# Altium footprint library decade_box_lib.PcbLib: 19 footprints (part 2 of 2)
Each footprint in its own frame and in the unit in brackets; x right, y up, seen from the top. Pads: shape width x height; smd on the part's side, far side on the other; paste and mask are expansions set on the pad; w line width, h text height; cw(c..) or ccw(c..) is an arc to the next point about the centre after c.
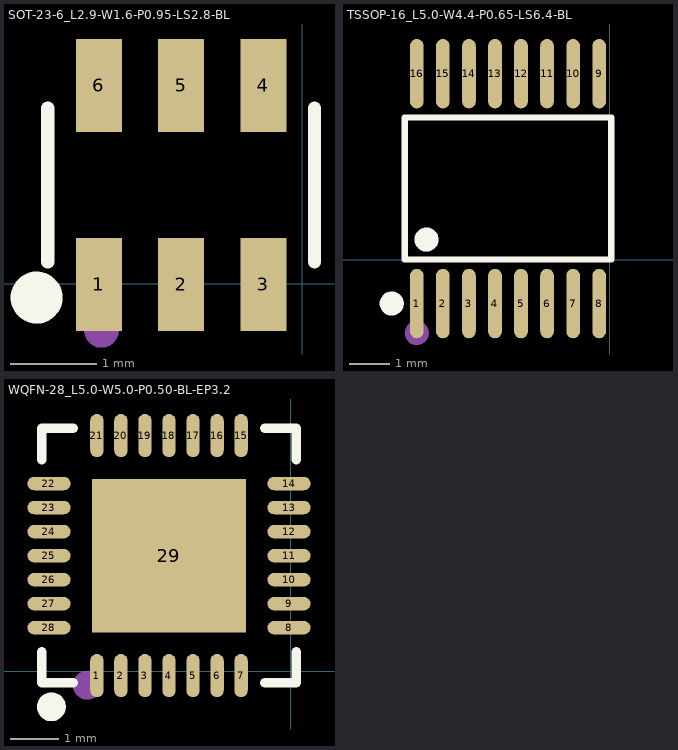
[diagram p1: the footprints below, top view; thin cyan lines are the x and y axes]

## SOT-23-6_L2.9-W1.6-P0.95-LS2.8-BL [mil]
pads (6):
  rect 20.95x42.2 smd: 1(-92.4,-0.24) 2(-55,-0.24) 3(-17.6,-0.24) 4(-17.6,90.24) 5(-55,90.24) 6(-92.4,90.24)
Top Overlay:
  circle w11.81: c-120.68,-6.24 r5.91
  lines w6: -115.6,9.99 -115.6,80.01 ; 5.6,9.99 5.6,80.01
Mechanical 15:
  circle w7.87: c-91.22,-21.14 r3.94
3D body "asd.stp": height 65.45, standoff 0.99, extent -112.1,-10.86 1.26,99.09

## TSSOP-16_L5.0-W4.4-P0.65-LS6.4-BL [mm]
pads (16):
  oval 0.343x1.731 smd: 1(-4.815,-1.088) 2(-4.165,-1.088) 3(-3.515,-1.088) 4(-2.865,-1.088) 5(-2.215,-1.088) 6(-1.565,-1.088) 7(-0.915,-1.088) 8(-0.265,-1.088) 9(-0.265,4.644) 10(-0.915,4.644) 11(-1.565,4.644) 12(-2.215,4.644) 13(-2.865,4.644) 14(-3.515,4.644) 15(-4.165,4.644) 16(-4.815,4.644)
Top Overlay:
  circle w0.3: c-5.439,-1.088 r0.15
  circle w0.3: c-4.572,0.508 r0.15
  lines w0.152: -5.116,0.007 0.036,0.007 0.036,3.55 -5.116,3.55 -5.116,0.007
Mechanical 15:
  circle w0.3: c-4.815,-1.822 r0.15

## WQFN-28_L5.0-W5.0-P0.50-BL-EP3.2 [mm]
pads (29):
  oval 0.28x0.9 smd: 1(-4.041,-0.087) 2(-3.541,-0.087) 3(-3.041,-0.087) 4(-2.54,-0.087) 5(-2.04,-0.087) 6(-1.539,-0.087) 7(-1.039,-0.087) 15(-1.039,4.913) 16(-1.539,4.913) 17(-2.04,4.913) 18(-2.54,4.913) 19(-3.041,4.913) 20(-3.541,4.913) 21(-4.041,4.913)
  oval 0.9x0.28 smd: 8(-0.04,0.912) 9(-0.04,1.412) 10(-0.04,1.913) 11(-0.04,2.413) 12(-0.04,2.913) 13(-0.04,3.414) 14(-0.04,3.914) 22(-5.04,3.914) 23(-5.04,3.414) 24(-5.04,2.913) 25(-5.04,2.413) 26(-5.04,1.913) 27(-5.04,1.412) 28(-5.04,0.912)
  rect 3.2x3.2 smd: 29(-2.54,2.413)
Top Overlay:
  lines w0.2: -5.19,0.413 -5.19,-0.237 -4.54,-0.237 ; -5.19,4.413 -5.19,5.063 -4.54,5.063 ; -0.54,-0.237 0.11,-0.237 0.11,0.413 ; -0.54,5.063 0.11,5.063 0.11,4.413
  lines w0.3: -4.991,-0.587 ccw(c-4.99,-0.737) -4.989,-0.587
Mechanical 15:
  circle w0.3: c-4.24,-0.287 r0.15
3D body "asd.stp": height 1.02, standoff 0, extent -5.059,-0.08 -0.039,4.94